# Altium footprint library SEMICONDUCTORS.PcbLib: 91 footprints (part 3 of 6)
Each footprint in its own frame and in the unit in brackets; x right, y up, seen from the top. Pads: shape width x height; smd on the part's side, far side on the other; paste and mask are expansions set on the pad; w line width, h text height; cw(c..) or ccw(c..) is an arc to the next point about the centre after c.
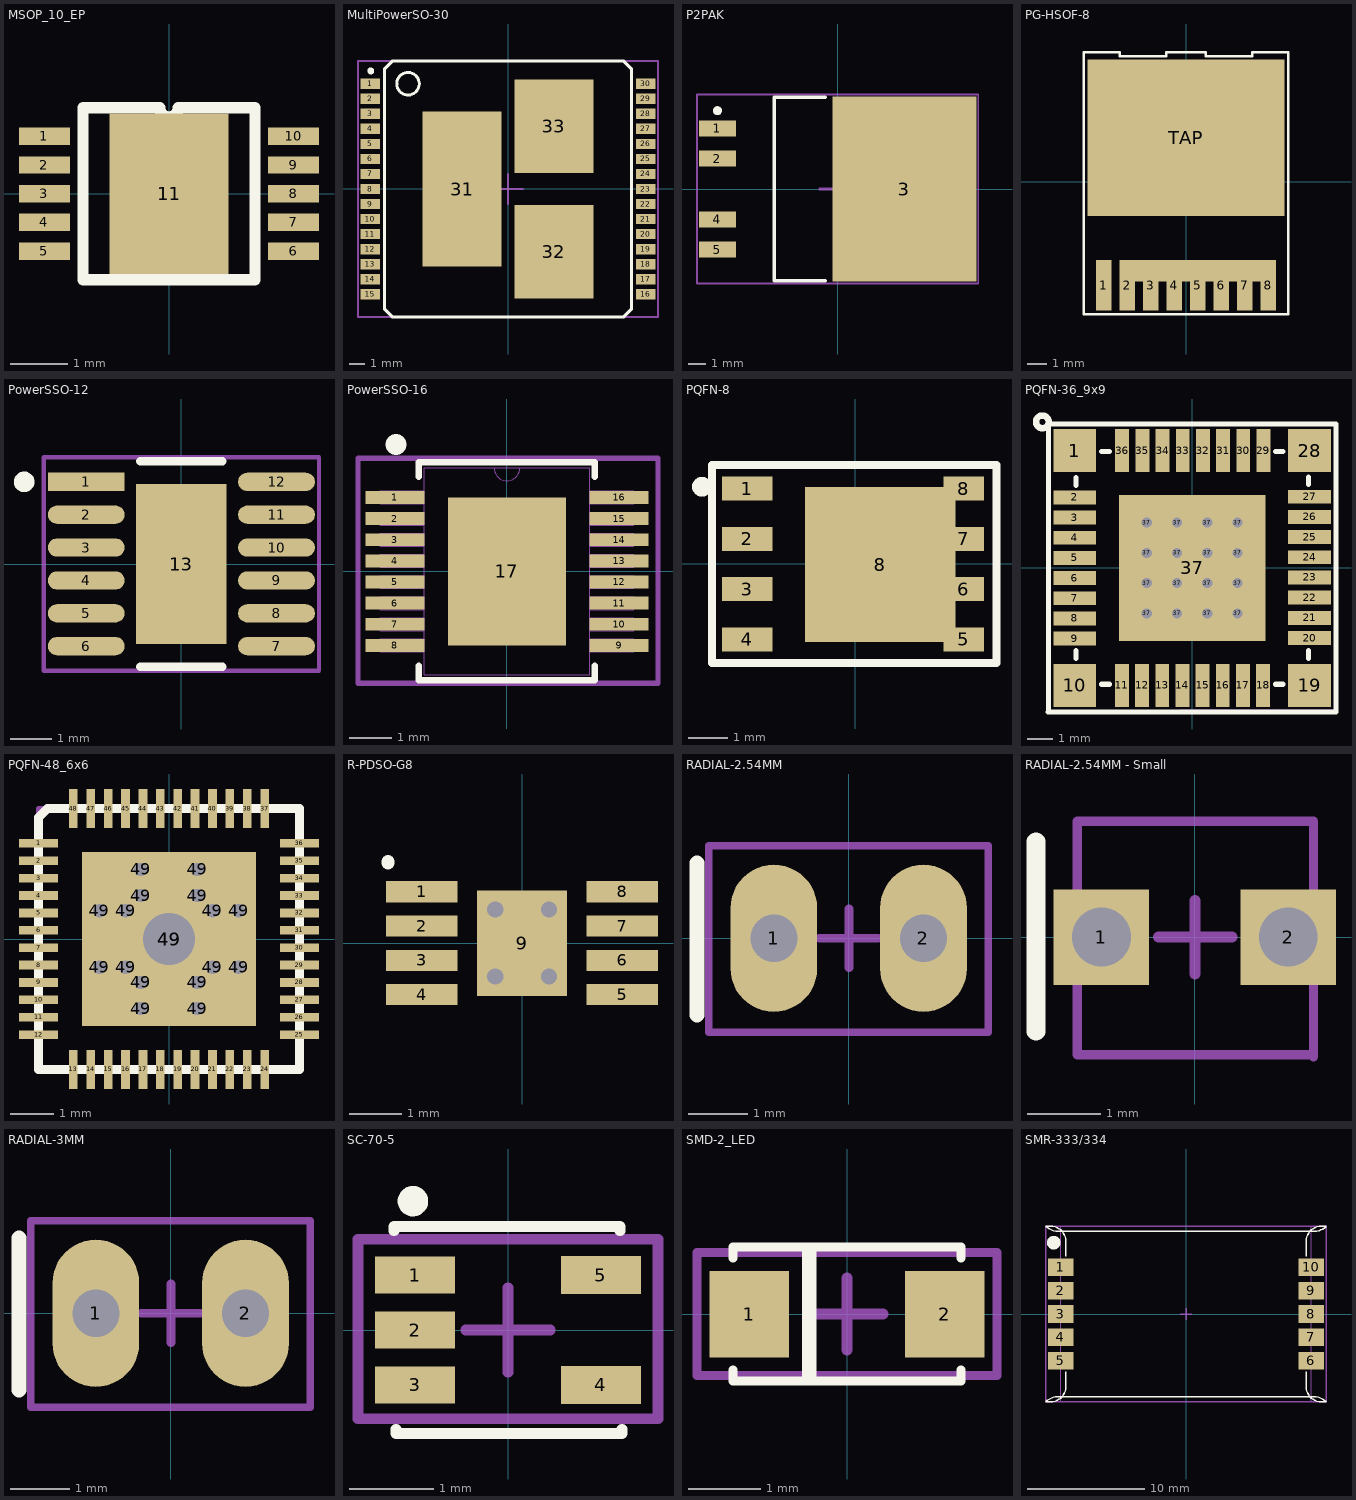
[diagram p2: the footprints below, top view; thin cyan lines are the x and y axes]

## MSOP_10_EP [mil] "10-Lead Plastic MSOP, Exposed Die Pad"
height 43
pads (11):
  rect 35x12.01 smd: 1(-85.5,39.37) 2(-85.5,19.68) 3(-85.5,0) 4(-85.5,-19.68) 5(-85.5,-39.37) 6(85.5,-39.37) 7(85.5,-19.68) 8(85.5,0) 9(85.5,19.68) 10(85.5,39.37)
  rect 82.01x110 smd: 11(0,0)
Top Overlay:
  lines w7.87: -59.06,-59.06 59.06,-59.06 59.06,59.06 6.42,59.06 cw(c0,59.06) -6.42,59.06 -59.06,59.06 -59.06,-59.06
3D body: height 31.5, standoff 0, extent -79.72,-54.13 78.74,54.13

## MultiPowerSO-30 [mm]
height 1
pads (33):
  rect 1.3x0.68 smd: 1(-9.15,7) 2(-9.15,6) 3(-9.15,5) 4(-9.15,4) 5(-9.15,3) 6(-9.15,2) 7(-9.15,1) 8(-9.15,0) 9(-9.15,-1) 10(-9.15,-2) 11(-9.15,-3) 12(-9.15,-4) 13(-9.15,-5) 14(-9.15,-6) 15(-9.15,-7) 16(9.15,-7) 17(9.15,-6) 18(9.15,-5) 19(9.15,-4) 20(9.15,-3) 21(9.15,-2) 22(9.15,-1) 23(9.15,0) 24(9.15,1) 25(9.15,2) 26(9.15,3) 27(9.15,4) 28(9.15,5) 29(9.15,6) 30(9.15,7)
  rect 5.25x10.3 smd: 31(-3.055,0)
  rect 5.25x6.23 smd: 32(3.055,-4.165) 33(3.055,4.165)
Top Overlay:
  circle w0.25: c-9.125,7.85 r0.1
  circle w0.2: c-6.65,7 r0.75
  lines w0.2: 7.7,8.5 -7.7,8.5 -8.2,8 -8.2,-8 -7.7,-8.5 7.7,-8.5 8.2,-8 ; 7.7,8.5 7.7,8.5 ; 7.7,8.5 8.2,8 8.2,-8 ; 8.2,-8 8.2,-8
Top Assembly:
  lines w0.127: -9.975,-8.525 -9.975,8.525 9.975,8.525 9.975,-8.525 9.6,-8.525 9.175,-8.525 1,-8.525 -2.05,-8.525 -9.975,-8.525
  text ".Designator" at -4.575,-0.625 h2
Top Component Center:
  lines w0.127: -1,0 1,0 ; 0,-1 0,1
3D body "MULTIPOWERSO-30.step": height 2.35, standoff 0, extent -9.574,-8.65 9.575,8.65

## P2PAK [mm]
pads (5):
  rect 2.1x0.9 smd: 1(-6.75,3.4) 2(-6.75,1.7) 4(-6.75,-1.7) 5(-6.75,-3.4)
  rect 8.1x10.4 smd: 3(3.75,0)
Top Overlay:
  circle w0.25: c-6.75,4.4 r0.125
  lines w0.2: -0.7,-5.15 -3.55,-5.15 -3.55,5.15 -0.7,5.15
Top Assembly:
  lines w0.1: -7.9,-5.3 7.9,-5.3 7.9,5.3 -7.9,5.3 -7.9,-5.3
  text ".Designator" at -1.775,-0.55 h2
Top Component Center:
  lines w0.15: -1,0.004 1,0.004 ; 0,-0.996 0,1.004
Mechanical 15:
  lines w0.1: -0.5,0 0.5,0 ; 0,-0.5 0,0.5
3D body "P2PAK.step": height 4.57, standoff 0.03, extent -7.8,-5.1 7.625,5.1

## PG-HSOF-8 [mm]
pads (10):
  rect 0.8x2.6 smd: 1(-4.2,-5.3) 2(-3,-5.3) 3(-1.8,-5.3) 4(-0.6,-5.3) 5(0.6,-5.3) 6(1.8,-5.3) 7(3,-5.3) 8(4.2,-5.3)
  rect 10.1x8 smd: TAP(0,2.25)
  rect 7x1.1 smd: ""(0.7,-4.55)
Top Overlay:
  lines w0.127: -5.225,-6.775 5.225,-6.775 5.225,6.625 3.4,6.625 3.4,6.425 1,6.425 1,6.625 -1,6.625 -1,6.425 -3.4,6.425 -3.4,6.625 -5.225,6.625 -5.225,-6.775
3D body: height 0.25, standoff 0, extent 14.525,3.675 14.525,3.675
3D body: height 0.25, standoff 0, extent 14.725,3.825 14.725,3.825
3D body "PG-HSOF-8.STEP": height 2.4, standoff 0, extent -4.95,-6.212 4.95,5.463

## PowerSSO-12 [mm]
height 1.092
pads (13):
  rect 1.874x0.443 smd paste+0 mask+0: 1(-2.316,2)
  oval 1.874x0.443 smd paste+0 mask+0: 2(-2.316,1.2) 3(-2.316,0.4) 4(-2.316,-0.4) 5(-2.316,-1.2) 6(-2.316,-2) 7(2.316,-2) 8(2.316,-1.2) 9(2.316,-0.4) 10(2.316,0.4) 11(2.316,1.2) 12(2.316,2)
  rect 2.2x3.9 smd paste-1000 mask+0: 13(0,0)
Top Overlay:
  circle w0.25: c-3.828,2 r0.125
  lines w0.2: -1.004,-2.5 1.004,-2.5 ; -1.004,2.5 1.004,2.5
Top Paste:
  rectangle: -0.594,-1.444 0.594,1.444
Top Assembly:
  lines w0.102: -3.35,-2.6 -3.35,2.6 3.35,2.6 3.35,-2.6 -3.35,-2.6
  text ".Designator" at -2.025,-0.6 h1.5
3D body "POWERSSO-12.STEP": height 1.82, standoff 0, extent -3,-2.45 3,2.45

## PowerSSO-16 [mil]
height 43.31
pads (17):
  rect 55x12 smd paste+0 mask+0: 1(-104.5,68.92) 2(-104.5,49.23) 3(-104.5,29.54) 4(-104.5,9.85) 5(-104.5,-9.85) 6(-104.5,-29.54) 7(-104.5,-49.23) 8(-104.5,-68.92) 9(104.5,-68.92) 10(104.5,-49.23) 11(104.5,-29.54) 12(104.5,-9.85) 13(104.5,9.85) 14(104.5,29.54) 15(104.5,49.23) 16(104.5,68.92)
  rect 110x138 smd paste-68.5 mask+0: 17(0,0)
Top Overlay:
  lines w6: -82,-88.02 -82,-101.5 82,-101.5 82,-88.02 ; -82,88.02 -82,101.5 82,101.5 82,88.02
  lines w19.68: -103.35,118.11 -103.35,118.11
Top Paste:
  region: 46.26,62.99 5.91,62.99 5.91,8.86 46.26,8.86
  region: -5.91,62.99 -46.26,62.99 -46.26,8.86 -5.91,8.86
  rectangle: 5.91,-62.99 46.26,-8.86
  rectangle: -46.26,-62.99 -5.91,-8.86
Top Assembly:
  lines w5: -138.78,-104.33 -138.78,105.31 140.75,105.31 140.75,-104.33 -138.78,-104.33
  text ".Designator" at 3.94,-112.2 h23.62
Mechanical 13:
  lines w0: -12,96.5 ccw(c0,96.5) 12,96.5
  lines w1: -118,-74.92 -118,-62.91 -77,-62.91 -77,-74.92 -118,-74.92 ; -118,-55.23 -118,-43.23 -77,-43.23 -77,-55.23 -118,-55.23 ; -118,-35.53 -118,-23.54 -77,-23.54 -77,-35.53 -118,-35.53 ; -118,-15.85 -118,-3.85 -77,-3.85 -77,-15.85 -118,-15.85 ; -118,3.85 -118,15.85 -77,15.85 -77,3.85 -118,3.85 ; -118,23.54 -118,35.53 -77,35.53 -77,23.54 -118,23.54 ; -118,43.23 -118,55.23 -77,55.23 -77,43.23 -118,43.23 ; -118,62.91 -118,74.92 -77,74.92 -77,62.91 -118,62.91 ; -77,-96.5 77,-96.5 77,96.5 -77,96.5 -77,-96.5 ; 77,-74.92 77,-62.91 118,-62.91 118,-74.92 77,-74.92 ; 77,-55.23 77,-43.23 118,-43.23 118,-55.23 77,-55.23 ; 77,-35.53 77,-23.54 118,-23.54 118,-35.53 77,-35.53 ; 77,-15.85 77,-3.85 118,-3.85 118,-15.85 77,-15.85 ; 77,3.85 77,15.85 118,15.85 118,3.85 77,3.85 ; 77,23.54 77,35.53 118,35.53 118,23.54 77,23.54 ; 77,43.23 77,55.23 118,55.23 118,43.23 77,43.23 ; 77,62.91 77,74.92 118,74.92 118,62.91 77,62.91
  text "*" at -74.5,43.5 h50
3D body "POWERSSO16_STM.step": height 63.11, standoff 0, extent -117.99,-96.49 118,96.5

## PQFN-8 [mm]
pads (9):
  rect 1.27x0.61 smd: 1(-2.733,1.905) 2(-2.733,0.635) 3(-2.733,-0.635) 4(-2.733,-1.905)
  rect 1.02x0.61 smd: 5(2.733,-1.905) 6(2.733,-0.635) 7(2.733,0.635) 8(2.733,1.905)
  rect 3.81x3.91 smd paste-40: 8(0.628,-0.014)
Top Overlay:
  circle w0.25: c-3.875,1.95 r0.125
  lines w0.2: -3.625,-2.502 -3.625,2.498 3.568,2.505 3.568,-2.495 -3.625,-2.502
Top Paste:
  region: 0.635,-0.381 0.635,-1.581 1.935,-1.581 1.935,-0.381
  region: -1.016,-0.381 -1.016,-1.581 0.284,-1.581 0.284,-0.381
  region: -1.036,1.579 -1.036,0.379 0.264,0.379 0.264,1.579
  region: 0.615,1.579 0.615,0.379 1.915,0.379 1.915,1.579
Top Assembly:
  lines w0.127: -3.625,-2.5 3.575,-2.5 3.575,2.525 -3.625,2.525 -3.625,-2.5
Top Component Center:
  lines w0.15: -0.5,0.004 0.5,0.004 ; 0,-0.496 0,0.504
3D body "PQFN-8.step": height 1.1, standoff 0, extent -3.125,-2.6 3.125,2.6
3D body: height 0.25, standoff 0, extent 0,0 0,0

## PQFN-36_9x9 [mm]
pads (53):
  rect 1.7x1.7 smd paste-0.13: 1(-4.65,4.65) 10(-4.65,-4.65) 19(4.65,-4.65) 28(4.65,4.65)
  rect 1.7x0.55 smd paste-0.13: 2(-4.65,2.798) 3(-4.65,1.998) 4(-4.65,1.198) 5(-4.65,0.398) 6(-4.65,-0.402) 7(-4.65,-1.202) 8(-4.65,-2.002) 9(-4.65,-2.802) 20(4.65,-2.776) 21(4.65,-1.976) 22(4.65,-1.176) 23(4.65,-0.376) 24(4.65,0.424) 25(4.65,1.224) 26(4.65,2.024) 27(4.65,2.824)
  rect 0.55x1.7 smd paste-0.13: 11(-2.786,-4.65) 12(-1.986,-4.65) 13(-1.186,-4.65) 14(-0.386,-4.65) 15(0.414,-4.65) 16(1.214,-4.65) 17(2.014,-4.65) 18(2.814,-4.65) 29(2.827,4.65) 30(2.027,4.65) 31(1.227,4.65) 32(0.427,4.65) 33(-0.373,4.65) 34(-1.173,4.65) 35(-1.973,4.65) 36(-2.773,4.65)
  round 0.4 hole 0.4: 37(-1.8,-1.8) 37(-1.8,-0.6) 37(-1.8,0.6) 37(-1.8,1.8) 37(-0.6,-1.8) 37(-0.6,-0.6) 37(-0.6,0.6) 37(-0.6,1.8) 37(0.6,-1.8) 37(0.6,-0.6) 37(0.6,0.6) 37(0.6,1.8) 37(1.8,-1.8) 37(1.8,-0.6) 37(1.8,0.6) 37(1.8,1.8)
  rect 5.8x5.8 smd paste-1.5: 37(0,0)
Top Overlay:
  lines w0.2: -5.715,-5.7 5.7,-5.7 5.7,5.7 -5.7,5.7 -5.7,-5.7 ; -4.608,-3.581 -4.608,-3.277 ; -4.608,3.277 -4.608,3.581 ; -3.581,-4.608 -3.277,-4.608 ; -3.581,4.608 -3.277,4.608 ; 3.302,-4.608 3.607,-4.608 ; 3.302,4.608 3.607,4.608 ; 4.608,-3.581 4.608,-3.277 ; 4.608,3.302 4.608,3.607
  lines w0.254: -5.7,5.7 cw(c-5.935,5.788) -5.684,5.788
Top Assembly:
  lines w0.127: -5.7,-5.725 -5.7,5.7 5.7,5.7 5.7,-5.675 -0.45,-5.675 -0.5,-5.725 -3.55,-5.725 -5.7,-5.725
  text ".Designator" at -3.175,-0.8 h2
Top Component Center:
  lines w0.127: -1,0 1,0 ; 0,-1 0,1
3D body: height 0.65, standoff 0, extent -4.525,-4.525 -3.8,-3.8
3D body: height 0.65, standoff 0, extent -4.525,3.8 -3.8,4.525
3D body: height 0.65, standoff 0, extent 3.8,3.8 4.525,4.525
3D body: height 0.65, standoff 0, extent 3.8,-4.525 4.525,-3.8
3D body: height 0.65, standoff 0, extent 2.55,-4.525 3.1,-3.375
3D body: height 0.65, standoff 0, extent 1.75,-4.525 2.3,-3.375
3D body: height 0.65, standoff 0, extent 0.95,-4.525 1.5,-3.375
3D body: height 0.65, standoff 0, extent 0.15,-4.525 0.7,-3.375
3D body: height 0.65, standoff 0, extent -0.65,-4.525 -0.1,-3.375
3D body: height 0.65, standoff 0, extent -1.45,-4.525 -0.9,-3.375
3D body: height 0.65, standoff 0, extent -2.25,-4.525 -1.7,-3.375
3D body: height 0.65, standoff 0, extent -3.05,-4.525 -2.5,-3.375
3D body: height 0.65, standoff 0, extent 3.375,2.55 4.525,3.1
3D body: height 0.65, standoff 0, extent 3.375,1.75 4.525,2.3
3D body: height 0.65, standoff 0, extent 3.375,0.95 4.525,1.5
3D body: height 0.65, standoff 0, extent 3.375,0.15 4.525,0.7
3D body: height 0.65, standoff 0, extent 3.375,-0.65 4.525,-0.1
3D body: height 0.65, standoff 0, extent 3.375,-1.45 4.525,-0.9
3D body: height 0.65, standoff 0, extent 3.375,-2.25 4.525,-1.7
3D body: height 0.65, standoff 0, extent 3.375,-3.05 4.525,-2.5
3D body: height 0.65, standoff 0, extent -4.525,-3.075 -3.375,-2.525
3D body: height 0.65, standoff 0, extent -4.525,-2.275 -3.375,-1.725
3D body: height 0.65, standoff 0, extent -4.525,-1.475 -3.375,-0.925
3D body: height 0.65, standoff 0, extent -4.525,-0.675 -3.375,-0.125
3D body: height 0.65, standoff 0, extent -4.525,0.125 -3.375,0.675
3D body: height 0.65, standoff 0, extent -4.525,0.925 -3.375,1.475
3D body: height 0.65, standoff 0, extent -4.525,1.725 -3.375,2.275
3D body: height 0.65, standoff 0, extent -4.525,2.525 -3.375,3.075
3D body: height 0.65, standoff 0, extent 2.55,3.375 3.1,4.525
3D body: height 0.65, standoff 0, extent 1.75,3.375 2.3,4.525
3D body: height 0.65, standoff 0, extent 0.95,3.375 1.5,4.525
3D body: height 0.65, standoff 0, extent 0.15,3.375 0.7,4.525
3D body: height 0.65, standoff 0, extent -0.65,3.375 -0.1,4.525
3D body: height 0.65, standoff 0, extent -1.45,3.375 -0.9,4.525
3D body: height 0.65, standoff 0, extent -2.25,3.375 -1.7,4.525
3D body: height 0.65, standoff 0, extent -3.05,3.375 -2.5,4.525
3D body: height 2.2, standoff 0.05, extent -4.5,-4.5 4.5,4.5
3D body: height 2.21, standoff 0.5, extent -3.909,3.101 -3.112,3.899

## PQFN-48_6x6 [mm]
pads (66):
  rect 0.9x0.2 smd: 1(-3,2.2) 2(-3,1.8) 3(-3,1.4) 4(-3,1) 5(-3,0.6) 6(-3,0.2) 7(-3,-0.2) 8(-3,-0.6) 9(-3,-1) 10(-3,-1.4) 11(-3,-1.8) 12(-3,-2.2) 25(3,-2.2) 26(3,-1.8) 27(3,-1.4) 28(3,-1) 29(3,-0.6) 30(3,-0.2) 31(3,0.2) 32(3,0.6) 33(3,1) 34(3,1.4) 35(3,1.8) 36(3,2.2)
  rect 0.2x0.9 smd: 13(-2.2,-3) 14(-1.8,-3) 15(-1.4,-3) 16(-1,-3) 17(-0.6,-3) 18(-0.2,-3) 19(0.2,-3) 20(0.6,-3) 21(1,-3) 22(1.4,-3) 23(1.8,-3) 24(2.2,-3) 37(2.2,3) 38(1.8,3) 39(1.4,3) 40(1,3) 41(0.6,3) 42(0.2,3) 43(-0.2,3) 44(-0.6,3) 45(-1,3) 46(-1.4,3) 47(-1.8,3) 48(-2.2,3)
  rect 0.605x0.605 hole 0.305: 49(-1.6,-0.65) 49(-1.6,0.65) 49(-1,-0.65) 49(-1,0.65) 49(-0.65,-1.6) 49(-0.65,-1) 49(-0.65,1) 49(-0.65,1.6) 49(0.65,-1.6) 49(0.65,-1) 49(0.65,1) 49(0.65,1.6) 49(1,-0.65) 49(1,0.65) 49(1.6,-0.65) 49(1.6,0.65)
  rect 4x4 smd: 49(0,0)
  rect 1.8x1.8 hole 1.2: 49(0,0)
Top Overlay:
  lines w0.203: -3,-3 -3,-2.525 -3,2.525 -3,2.8 -2.8,3 -2.525,3 2.525,3 3,3 3,2.525 3,-2.525 3,-3 2.525,-3 -2.525,-3 -3,-3
Top Assembly:
  lines w0.127: -3,-3 -3,3 3,3 3,-3 2.45,-3 1.825,-3 0.175,-3 -3,-3
  text ".Designator" at -1.375,-0.45 h1
Top Component Center:
  lines w0.127: -0.5,0 0.5,0 ; 0,-0.5 0,0.5
3D body "PQFN-48_6X6.step": height 0.9, standoff 0, extent -3.025,-3.025 3.025,3.025
3D body: height 1.27, standoff 0, extent 5.5,2.475 5.5,2.475

## R-PDSO-G8 [mm] "8-TSSOP, 8-MSOP (0.118\", 3.00mm Width) Exposed Pad"
height 1.7
pads (9):
  rect 1.35x0.4 smd: 1(-1.9,0.975) 2(-1.9,0.325) 3(-1.9,-0.325) 4(-1.9,-0.975) 5(1.9,-0.975) 6(1.9,-0.325) 7(1.9,0.325) 8(1.9,0.975)
  rect 1.7x2 smd paste-0.4: 9(0,0)
via 0.508,0.635 diameter 0.505 hole 0.305
via -0.508,-0.635 diameter 0.505 hole 0.305
via 0.508,-0.635 diameter 0.505 hole 0.305
via -0.508,0.635 diameter 0.505 hole 0.305
Top Overlay:
  lines w0.254: -2.54,1.524 ccw(c-2.824,1.524) -2.54,1.54
3D body: height 1.1, standoff 0, extent -1.905,-1.143 1.905,1.143

## RADIAL-2.54MM [mm]
height 0.16
pads (2):
  oval 1.473x2.5 hole 0.8 mask+0.254: 1(-1.27,0) 2(1.27,0)
Top Overlay:
  lines w0.254: -2.575,-1.3 -2.575,1.275
Top Assembly:
  lines w0.127: -2.375,-1.6 2.375,-1.6 2.375,1.575 -2.375,1.575 -2.375,-1.6
  text ".Designator" at -1.475,-0.55 h1.2
Top Component Center:
  lines w0.15: -0.496,0 0.504,0 ; 0.004,-0.5 0.004,0.5

## RADIAL-2.54MM - Small [mm]
height 0.16
pads (2):
  rect 1.3x1.3 hole 0.8 mask+0.1: 1(-1.27,0) 2(1.27,0)
Top Overlay:
  lines w0.254: -2.159,-1.28 -2.159,1.295
Top Assembly:
  lines w0.127: 1.613,-1.625 1.613,1.575 -1.6,1.575 -1.6,-1.6 1.612,-1.6
  text ".Designator" at -1.475,-0.55 h1.2
Top Component Center:
  lines w0.15: -0.496,0 0.504,0 ; 0.004,-0.5 0.004,0.5

## RADIAL-3MM [mm]
height 0.16
pads (2):
  oval 1.473x2.5 hole 0.8 mask+0.1: 1(-1.27,0) 2(1.27,0)
Top Overlay:
  lines w0.254: -2.575,-1.3 -2.575,1.275
Top Assembly:
  lines w0.127: -2.375,-1.6 2.375,-1.6 2.375,1.575 -2.375,1.575 -2.375,-1.6
  text ".Designator" at -1.475,-0.55 h1.2
Top Component Center:
  lines w0.15: -0.496,0 0.504,0 ; 0.004,-0.5 0.004,0.5
3D body: height 1.99, standoff 0, extent -2.375,1.575 -2.375,1.575
3D body: height 1.99, standoff 0, extent -2.188,-1.325 2.188,1.25

## SC-70-5 [mm]
pads (5):
  rect 0.95x0.44 smd: 1(-1.1,0.65) 2(-1.1,0) 3(-1.1,-0.65)
  rect 0.95x0.45 smd: 4(1.1,-0.65) 5(1.1,0.65)
Top Overlay:
  circle w0.2: c-1.125,1.525 r0.08
  lines w0.127: -1.35,1.175 -1.35,1.225 1.325,1.225 1.325,1.175 ; -1.325,-1.175 -1.325,-1.225 1.35,-1.225 1.35,-1.175
Top Assembly:
  lines w0.127: -1.775,-1.05 -1.275,-1.05 1.775,-1.05 1.775,-0.35 1.775,1.075 -1.775,1.075 -1.775,-1.05
  text ".Designator" at -1.35,-0.45 h1
Top Component Center:
  lines w0.127: -0.5,0 0.5,0 ; 0,-0.5 0,0.5
3D body "SC-70-5.STEP": height 1.09, standoff -0.01, extent -1.05,-1 1.05,1

## SMD-2_LED [mm]
pads (2):
  rect 1.1x1.2 smd: 1(-1.35,-0.004) 2(1.35,-0.004)
Top Overlay:
  lines w0.127: -1.575,-0.775 -1.575,-0.925 1.575,-0.925 1.575,-0.775 ; -1.575,0.775 -1.575,0.925 1.575,0.925 1.575,0.775
  lines w0.2: -0.525,-0.875 -0.525,0.875
Top Assembly:
  lines w0.127: -2.075,-0.85 2.075,-0.85 2.075,0.85 -2.075,0.85 -2.075,-0.85
  text ".Designator" at -1.675,-0.3 h0.8
Top Component Center:
  lines w0.15: -0.5,0 0.5,0 ; 0,-0.5 0,0.5
3D body: height 0.6, standoff 0, extent 0.8,-0.5 1.45,0.5
3D body: height 0.6, standoff 0, extent -1.45,-0.5 -0.8,0.5
3D body: height 1.2, standoff 0.1, extent -1.4,-0.697 1.4,0.697
3D body: height 1.21, standoff 0.5, extent -1.125,-0.55 1.125,0.55
3D body: height 1.27, standoff 0, extent -0.15,3.625 -0.15,3.625

## SMR-333/334 [mm]
pads (10):
  rect 2.15x1.5 smd: 1(-10.7,4) 2(-10.7,2) 3(-10.7,0) 4(-10.7,-2) 5(-10.7,-4) 6(10.7,-4) 7(10.7,-2) 8(10.7,0) 9(10.7,2) 10(10.7,4)
Top Overlay:
  circle w1: c-11.3,6.1 r0.08
  lines w0.127: -12,7.5 -11.545,7.5 cw(c-11.545,6.23) -10.275,6.23 -10.275,4.95 ; -11.975,7.5 ccw(c-10.949,8.526) -10.949,7.075 11.009,7.075 ccw(c11.009,8.441) 11.975,7.475 ; -10.275,-4.95 -10.275,-6.23 cw(c-11.545,-6.23) -11.545,-7.5 -12,-7.5 cw(c-10.974,-8.526) -10.974,-7.075 10.949,-7.075 cw(c10.949,-8.526) 11.975,-7.5 11.545,-7.5 cw(c11.545,-6.23) 10.275,-6.23 10.275,-4.95 ; 10.275,4.95 10.275,6.23 cw(c11.545,6.23) 11.545,7.5 11.975,7.5
Top Assembly:
  lines w0.127: -12,-7.5 -12,7.5 11.975,7.5 11.975,-7.5 -12,-7.5
  text ".Designator" at -3.425,-0.325 h1
Top Component Center:
  lines w0.127: -0.5,0 0.5,0 ; 0,-0.5 0,0.5
Mechanical 13:
  lines w0.025: -10.7,-7.5 10.7,-7.5 10.7,7.5 -10.7,7.5 -10.7,-7.5
3D body: height 2.21, standoff 0, extent 10,-4.825 10.225,-3.175
3D body: height 2.21, standoff 0, extent 10,-2.825 10.225,-1.175
3D body: height 2.21, standoff 0, extent 10,-0.825 10.225,0.825
3D body: height 2.21, standoff 0, extent 10,1.175 10.225,2.825
3D body: height 2.21, standoff 0, extent 10,3.175 10.225,4.825
3D body: height 2.21, standoff 0, extent -10.225,-4.825 -10,-3.175
3D body: height 2.21, standoff 0, extent -10.225,-2.825 -10,-1.175
3D body: height 2.21, standoff 0, extent -10.225,-0.825 -10,0.825
3D body: height 2.21, standoff 0, extent -10.225,1.175 -10,2.825
3D body: height 2.21, standoff 0, extent -10.225,3.175 -10,4.825
3D body: height 2.2, standoff 0, extent -10.2,-7 10.2,7
3D body: height 3.1, standoff 2.2, extent -10.7,-7.5 10.7,7.5